# Altium footprint library First Board IMX6.PcbLib: 204 footprints (part 4 of 13)
Each footprint in its own frame and in the unit in brackets; x right, y up, seen from the top. Pads: shape width x height; smd on the part's side, far side on the other; paste and mask are expansions set on the pad; w line width, h text height; cw(c..) or ccw(c..) is an arc to the next point about the centre after c.
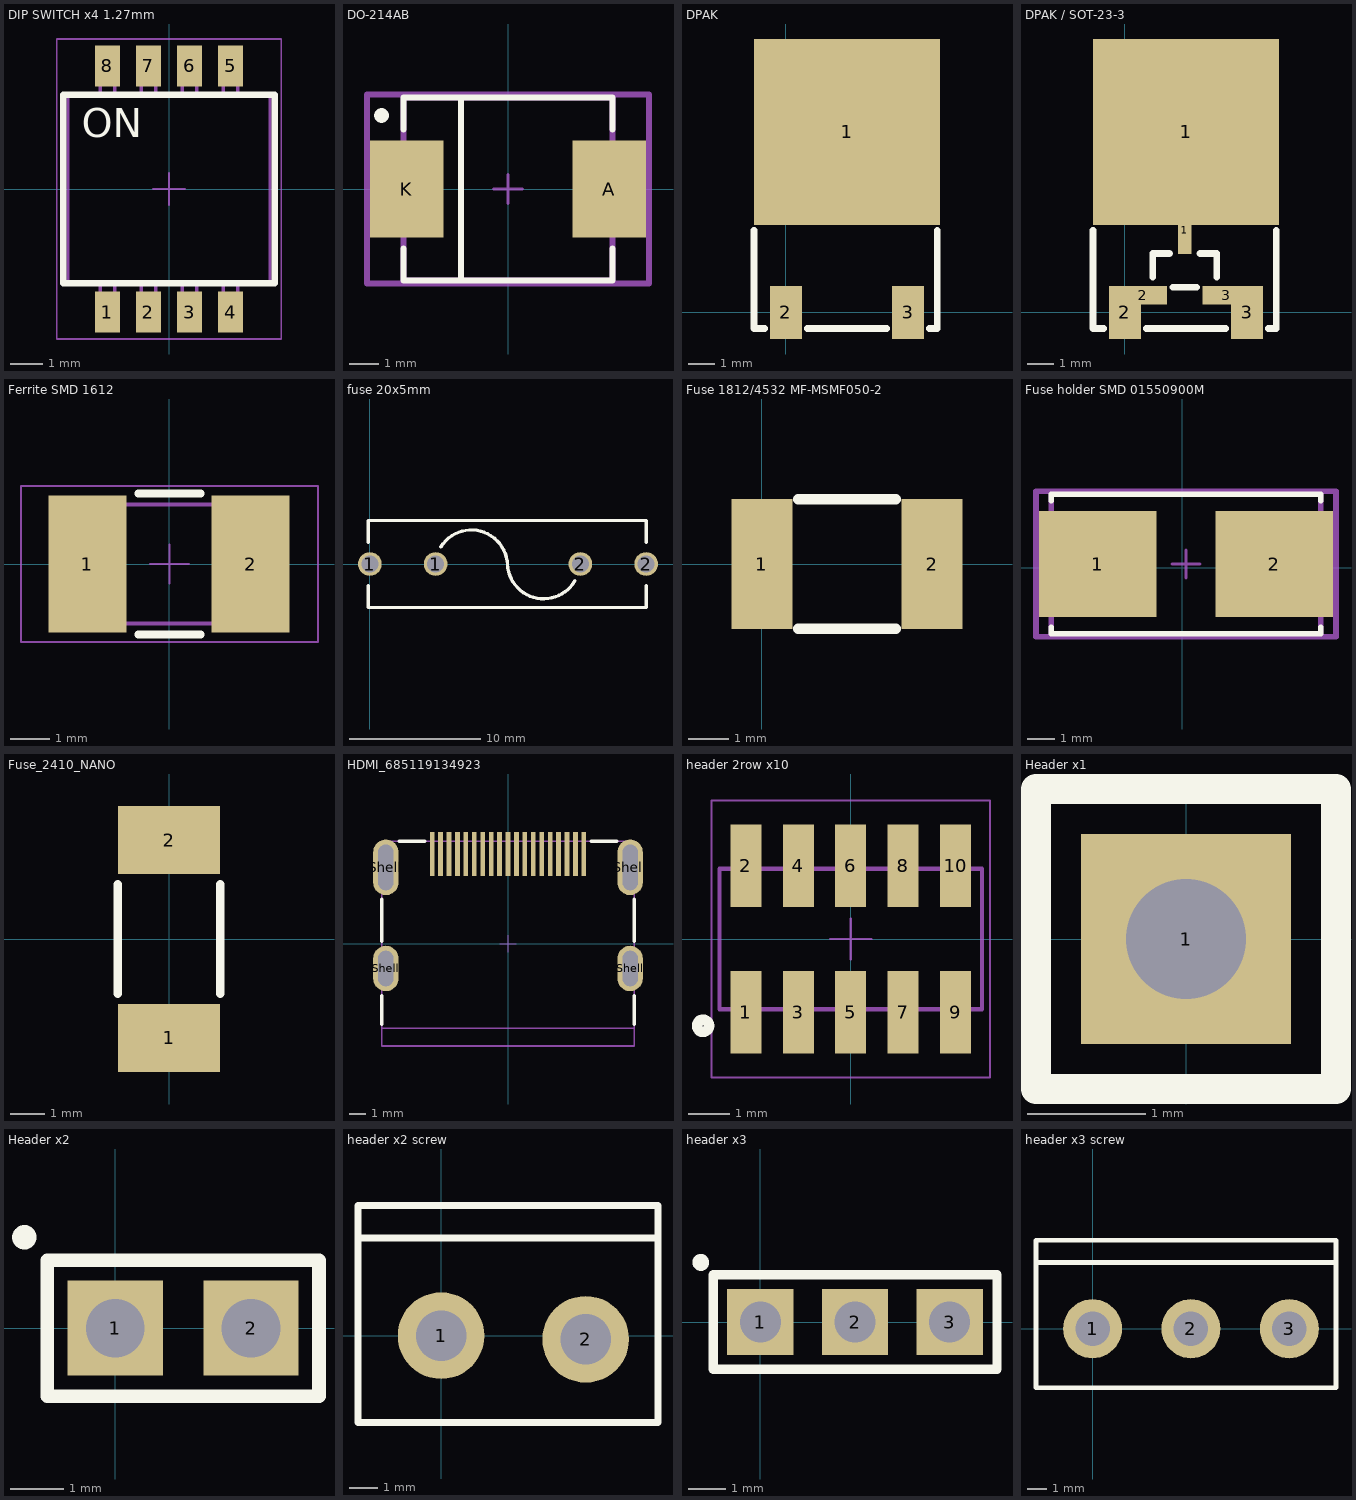
[diagram p3: the footprints below, top view; thin cyan lines are the x and y axes]

## DIP SWITCH x4 1.27mm [mm]
pads (8):
  rect 0.76x1.27 smd: 1(-1.905,-3.81) 2(-0.635,-3.81) 3(0.635,-3.81) 4(1.905,-3.81) 5(1.905,3.81) 6(0.635,3.81) 7(-0.635,3.81) 8(-1.905,3.81)
Top Overlay:
  lines w0.2: -3.275,-2.925 -3.275,2.925 3.275,2.925 3.275,-2.925 -3.275,-2.925
  text "ON" at -2.705,1.6 h0.89
Mechanical 13:
  lines w0.1: -2.13,-2.9 -2.13,-4.32 -1.68,-4.32 -1.68,-2.9 ; -2.13,2.9 -2.13,4.32 -1.68,4.32 -1.68,2.9 ; -0.86,-2.9 -0.86,-4.32 -0.41,-4.32 -0.41,-2.9 ; -0.86,2.9 -0.86,4.32 -0.41,4.32 -0.41,2.9 ; 0.41,-2.9 0.41,-4.32 0.86,-4.32 0.86,-2.9 ; 0.41,2.9 0.41,4.32 0.86,4.32 0.86,2.9 ; 1.68,-2.9 1.68,-4.32 2.13,-4.32 2.13,-2.9 ; 1.68,2.9 1.68,4.32 2.13,4.32 2.13,2.9 ; -3.125,-2.9 3.125,-2.9 3.125,2.9 -3.125,2.9 -3.125,-2.9
  text "ON" at -2.705,1.6 h0.89
Mechanical 15:
  lines w0.05: -0.5,0 0.5,0 ; 0,-0.5 0,0.5 ; -3.475,-4.645 -3.475,4.645 3.475,4.645 3.475,-4.645 -3.475,-4.645
3D body "416131160804.stp": height 2.7, standoff 0, extent -3.125,-4.22 3.125,4.22

## DO-214AB [mm]
pads (2):
  rect 2.5x3.3 smd paste+0: A(3.45,0) K(-3.45,0)
Top Overlay:
  circle w0.25: c-4.3,2.5 r0.125
  lines w0.2: -3.555,-2.025 -3.555,-3.11 3.555,-3.11 3.555,-2.025 ; -3.555,2.025 -3.555,3.11 3.555,3.11 3.555,2.025 ; -1.6,-3.1 -1.6,3.1
Mechanical 10:
  lines w0.2: -4.8,-3.21 -4.8,3.21 4.8,3.21 4.8,-3.21 -4.8,-3.21
  text ".Designator" at 0,0.188 h1
Bottom Assembly:
  lines w0.2: -3.555,-3.11 -3.555,3.11 3.555,3.11 3.555,-3.11 -3.555,-3.11
Mechanical 15:
  lines w0.1: -0.5,0 0.5,0 ; 0,-0.5 0,0.5
  lines w0.2: -4.8,-3.21 -4.8,3.21 4.8,3.21 4.8,-3.21 -4.8,-3.21
3D body "Diode_Micro_Commercial_Components_SMLJ60S6-TP_eec.STEP": height 0.25, standoff 0, extent -4.8,-3.21 4.8,3.21

## DPAK [mm]
pads (3):
  rect 7x7 smd: 1(2.3,6.8)
  rect 1.2x2 smd: 2(0,0) 3(4.6,0)
Top Overlay:
  lines w0.254: -1.2,3.1 -1.2,-0.6 -0.8,-0.6 ; 0.8,-0.6 3.8,-0.6 ; 5.4,-0.6 5.7,-0.6 5.7,3.1
3D body "DPAK.step": height 2.37, standoff -0.03, extent -1.067,-0.5 5.667,9.6

## DPAK / SOT-23-3 [mm]
pads (6):
  rect 0.508x1.8 smd: 1(2.25,3.1)
  rect 7x7 smd: 1(2.3,6.8)
  rect 1.2x2 smd: 2(0,0) 3(4.6,0)
  rect 1.8x0.7 smd: 2(0.675,0.65) 3(3.825,0.65)
Top Overlay:
  lines w0.254: -1.2,3.1 -1.2,-0.6 -0.8,-0.6 ; 0.8,-0.6 3.8,-0.6 ; 1.046,1.335 1.046,2.224 1.681,2.224 ; 1.808,0.954 2.697,0.954 ; 2.824,2.224 3.459,2.224 3.459,1.335 ; 5.4,-0.6 5.7,-0.6 5.7,3.1
3D body "DPAK.step": height 2.37, standoff -0.03, extent -1.175,-0.55 5.559,9.55

## Ferrite SMD 1612 [mm]
pads (2):
  rect 2x3.5 smd: 1(-2.1,0) 2(2.075,0)
Top Overlay:
  lines w0.2: -0.8,-1.8 0.8,-1.8 ; -0.8,1.8 0.8,1.8
Top Assembly:
  text ".Designator" at -1.346,-0.538 h1.52
Mechanical 13:
  lines w0.1: -2.03,-1.525 2.03,-1.525 2.03,1.525 -2.03,1.525 -2.03,-1.525
Mechanical 15:
  lines w0.05: -0.5,0 0.5,0 ; 0,-0.5 0,0.5 ; -3.8,-2 -3.8,2 3.8,2 3.8,-2 -3.8,-2
3D body "WE-CBF_161208.stp": height 2.28, standoff 0, extent -2.03,-1.525 2.03,1.525

## fuse 20x5mm [mm]
pads (4):
  round 1.8 hole 1.3: 1(0,0) 1(5,0) 2(16,0) 2(21,0)
Top Overlay:
  lines w0.254: -0.127,-1.651 -0.127,-3.302 21,-3.302 21,-1.651 ; -0.127,1.651 -0.127,3.302 21,3.302 21,1.651 ; 5.399,1.316 cw(c7.716,-0.16) 10.46,-0.029 ccw(c13.205,0.102) 15.596,-1.252
3D body "fuse clip x1.step": height 11.12, standoff -3.3, extent -0.302,-3.866 5.302,3.866
3D body "fuse clip x1.step": height 11.12, standoff -3.3, extent 15.698,-3.866 21.302,3.866
3D body "Fuse 5x20.step": height 11.5, standoff 6.5, extent 0.3,-2.4 20.3,2.6

## Fuse 1812/4532 MF-MSMF050-2 [mm]
pads (2):
  rect 1.5x3.2 smd: 1(0,0) 2(4.2,0)
Top Overlay:
  lines w0.254: 0.9,-1.6 3.3,-1.6 ; 0.9,1.6 3.3,1.6
3D body "MF-MSMF050-2.step": height 0.71, standoff 0, extent -0.175,-1.64 4.375,1.6

## Fuse holder SMD 01550900M [mil]
pads (2):
  rect 167x150 smd paste+0 mask+0: 1(-120.5,5) 2(130.5,5)
Top Overlay:
  lines w7.87: -186.54,-84.76 -186.54,-94.02 196.54,-94.02 196.54,-84.76 ; -186.54,94.76 -186.54,104.02 196.54,104.02 196.54,94.76
Mechanical 10:
  lines w7.87: -207.94,-97.95 217.94,-97.95 217.94,107.95 -207.94,107.95 -207.94,-97.95
  text ".Designator" at 5,5 h39.37
Bottom Assembly:
  lines w7.87: -186.54,-94.02 196.54,-94.02 196.54,104.02 -186.54,104.02 -186.54,-94.02
Mechanical 15:
  lines w3.94: -14.69,5 24.68,5 ; 5,-14.69 5,24.68
  lines w7.87: -207.94,-97.95 217.94,-97.95 217.94,107.95 -207.94,107.95 -207.94,-97.95
3D body "Fuse_Littelfuse_Inc_01550900M_eec.STEP": height 10, standoff 0, extent -207.94,-97.95 217.94,107.95

## Fuse_2410_NANO [mm]
pads (2):
  rect 3x2 smd: 1(0,-2.9) 2(0,2.9)
Top Overlay:
  lines w0.254: -1.5,-1.6 -1.5,1.6 ; 1.5,-1.6 1.5,1.6
3D body "Fuse_SMD_2410_NANO.step": height 2.79, standoff 0.1, extent -1.338,-2.95 1.352,3.15

## HDMI_685119134923 [mm]
pads (23):
  rect 0.28x2.6 smd: 1(4.5,5.325) 2(4,5.325) 3(3.5,5.325) 4(3,5.325) 5(2.5,5.325) 6(2,5.325) 7(1.5,5.325) 8(1,5.325) 9(0.5,5.325) 10(0,5.325) 11(-0.5,5.325) 12(-1,5.325) 13(-1.5,5.325) 14(-2,5.325) 15(-2.5,5.325) 16(-3,5.325) 17(-3.5,5.325) 18(-4,5.325) 19(-4.5,5.325)
  oval 1.5x2.7 hole 0.9 slot 2.1 at 90 deg: Shell(-7.25,-1.475) Shell(7.25,-1.475)
  oval 1.5x3.3 hole 0.9 slot 2.7 at 90 deg: Shell(-7.25,4.525) Shell(7.25,4.525)
Top Overlay:
  lines w0.2: -7.5,-4.775 -7.5,-3.075 ; -7.5,0.125 -7.5,2.625 ; -6.45,6.075 -4.95,6.075 ; 4.95,6.075 6.45,6.075 ; 7.5,-4.775 7.5,-3.075 ; 7.5,0.125 7.5,2.625
Mechanical 2:
  lines w0.1: -7.5,-5.025 7.5,-5.025
  text "PCB Edge" at -1.989,-5.88 h0.61
Mechanical 13:
  lines w0.1: 7.5,6.075 7.5,-6.075 -7.5,-6.075 -7.5,6.075 7.5,6.075
Mechanical 15:
  lines w0.05: -0.5,0 0.5,0 ; 0,-0.5 0,0.5
3D body "685119134923.stp": height 6.17, standoff -2.2, extent -7.55,-6.075 7.45,6.075

## header 2row x10 [mm] "Pin Header, pitch 1.27 mm, SMD, Vertical, dual row, 10p"
height 6.1
pads (10):
  rect 0.75x2 smd: 1(-2.54,-1.775) 2(-2.54,1.775) 3(-1.27,-1.775) 4(-1.27,1.775) 5(0,-1.775) 6(0,1.775) 7(1.27,-1.775) 8(1.27,1.775) 9(2.54,-1.775) 10(2.54,1.775)
Top Overlay:
  circle w0.254: c-3.575,-2.1 r0.146
Top Assembly:
  lines w0.1: -3.175,-1.7 3.175,-1.7 3.175,1.7 -3.175,1.7 -3.175,-1.7
  text ".Designator" at -2.073,-0.5 h1.5
Top Courtyard:
  lines w0.05: -0.5,0 0.5,0 ; 0,-0.5 0,0.5 ; -3.375,-3.35 3.375,-3.35 3.375,3.35 -3.375,3.35 -3.375,-3.35
Top 3D Body:
  lines w0.1: -3.175,-1.7 3.175,-1.7 3.175,1.7 -3.175,1.7 -3.175,-1.7
3D body "62131021021.stp": height 5.9, standoff 0, extent -3.175,-2.55 3.175,2.55

## Header x1 [mil]
pads (1):
  rect 70x70 hole 40: 1(0,0)
Top Overlay:
  lines w10: -50,-50 50,-50 50,50 -50,50 -50,-50
3D body "header male x1.step": height 235.86, standoff -113.75, extent -50,-50 50,50

## Header x2 [mil]
pads (2):
  rect 70x70 hole 43.31: 1(0,0) 2(100,0)
Top Overlay:
  circle w10: c-66.93,66.93 r3.94
  lines w10: -50,-50 -50,50 150,50 150,-50 -50,-50
3D body "header male x2.step": height 235.86, standoff -113.75, extent -50,-50 150,50

## header x2 screw [mil]
pads (2):
  round 120 hole 70: 1(0,0) 2(200,-5)
Top Overlay:
  lines w10: -115,135 300,135 ; -115,-120 -115,180 300,180 300,-120 -115,-120
3D body "Terminal-Screw-3A-2way.step": height 393.7, standoff -118.11, extent -115.47,-119.6 301.86,179.61

## header x3 [mil]
pads (3):
  rect 70x70 hole 43.31: 1(0,0) 2(100,0) 3(200,0)
Top Overlay:
  circle w10: c-62.99,62.99 r3.94
  lines w10: -50,-50 -50,50 250,50 250,-50 -50,-50
3D body "header male x3.step": height 233.86, standoff -115.75, extent -50,-49.99 250,50.01

## header x3 screw [mil]
pads (3):
  round 120 hole 70: 1(0,0) 2(200,0) 3(400,0)
Top Overlay:
  lines w10: -115,135 495,135 ; -115,-120 495,-120 495,180 -115,180 -115,-120
3D body "Terminal-Screw-3A-3way.step": height 393.7, standoff -118.11, extent -117.09,-119.21 497.09,180